# Altium footprint library Velotour_2022.PcbLib: 30 footprints (part 2 of 2)
Each footprint in its own frame and in the unit in brackets; x right, y up, seen from the top. Pads: shape width x height; smd on the part's side, far side on the other; paste and mask are expansions set on the pad; w line width, h text height; cw(c..) or ccw(c..) is an arc to the next point about the centre after c.
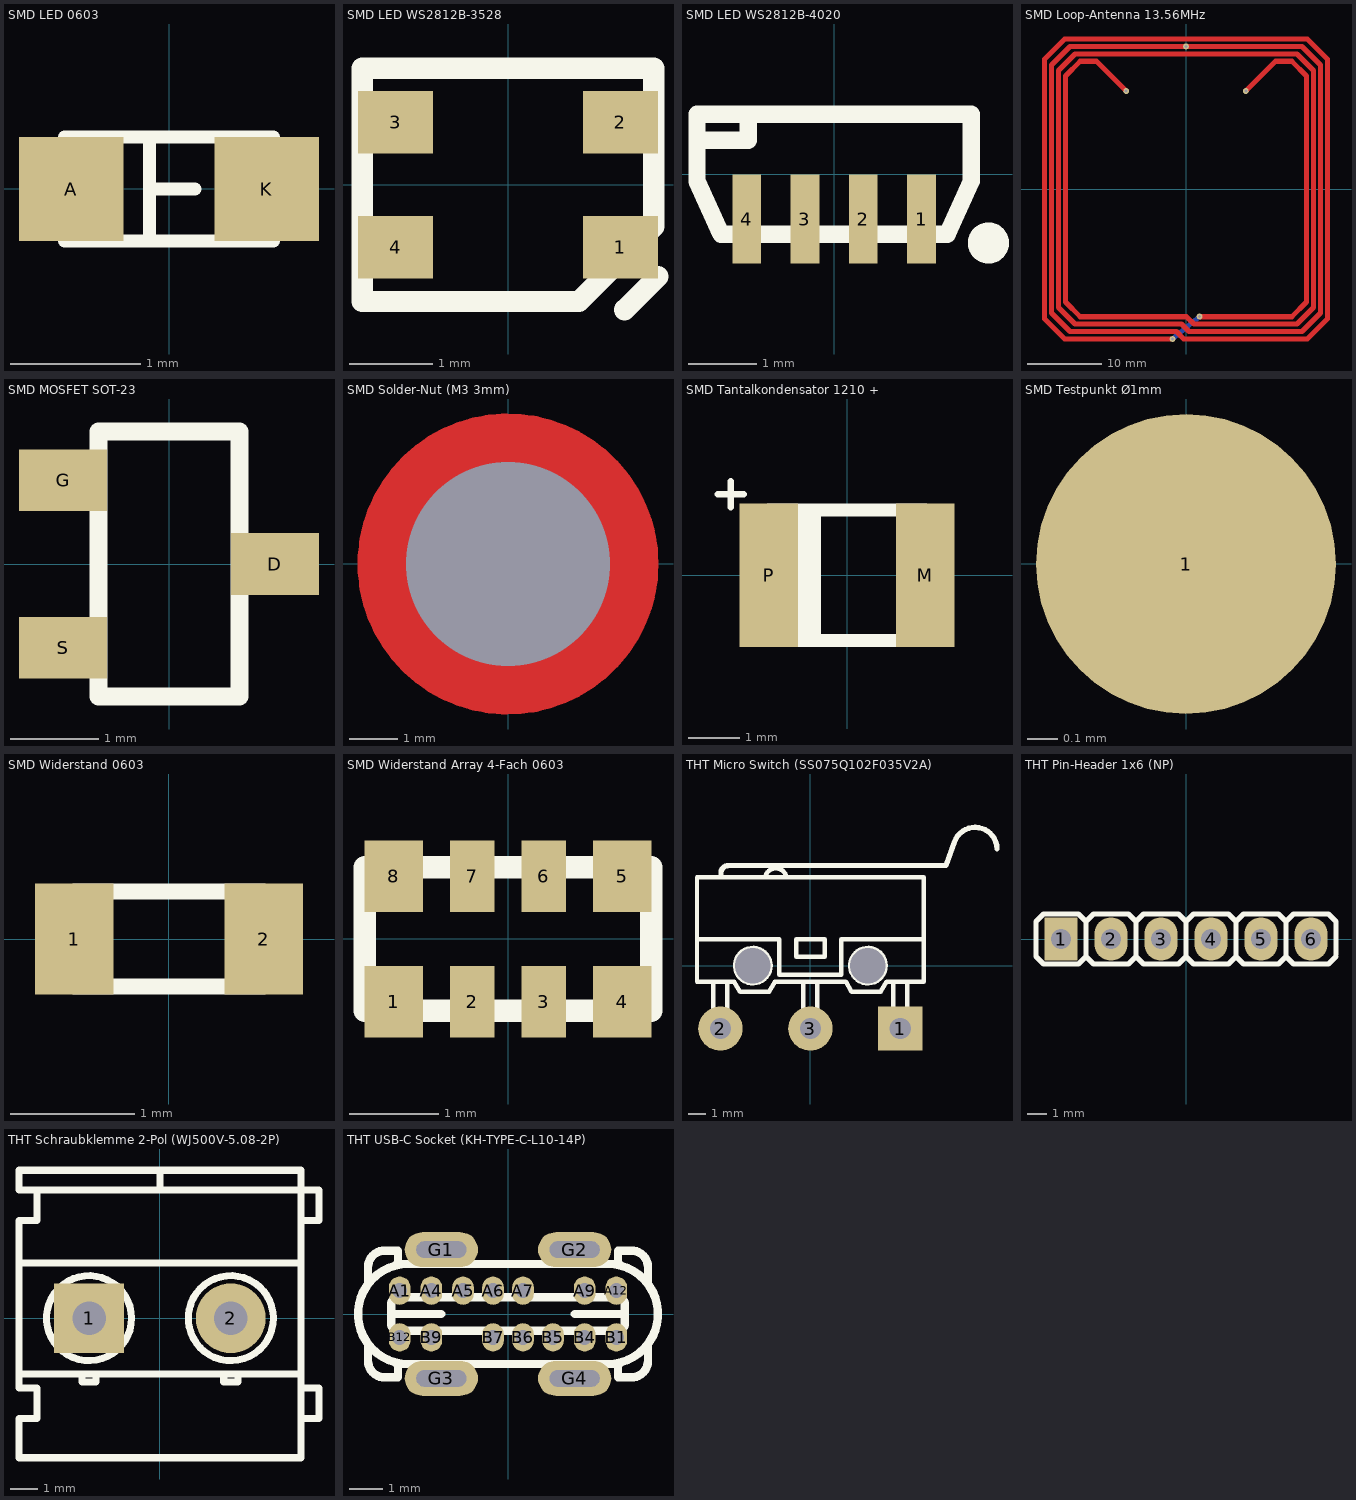
[diagram p1: the footprints below, top view; thin cyan lines are the x and y axes]

## SMD LED 0603 [mm] "SMD_LED_RED"
height 8.65
pads (2):
  rect 0.8x0.8 smd: A(-0.75,0) K(0.75,0)
Top Overlay:
  lines w0.1: -0.15,-0.4 -0.15,0.4 ; -0.15,0 0.2,0 ; -0.8,-0.4 0.8,-0.4 0.8,0.4 -0.8,0.4 -0.8,-0.4
3D body "User Library-LED SMD0603.step": height 0.68, standoff 0, extent -0.808,-0.368 0.842,0.357

## SMD LED WS2812B-3528 [mm] "SMD_LED_RED"
height 8.65
pads (4):
  rect 0.9x0.75 smd: 1(1.35,-0.75) 2(1.35,0.75) 3(-1.35,0.75) 4(-1.35,-0.75)
Top Overlay:
  lines w0.254: 1.4,-1.5 1.8,-1.1 ; -1.75,-1.4 -1.75,1.4 1.75,1.4 1.75,-0.5 0.85,-1.4 -1.75,-1.4
3D body "User Library-KAA-3528.x_t": height 1.9, standoff 0, extent -1.75,-1.4 1.75,1.4

## SMD LED WS2812B-4020 [mm] "SMD_LED_RED"
height 8.65
pads (4):
  rect 0.42x1.3 smd: 1(1.275,-0.65) 2(0.425,-0.65) 3(-0.425,-0.65) 4(-1.275,-0.65)
Top Overlay:
  circle w0.35: c2.25,-1 r0.125
  lines w0.254: -2,0.5 -1.25,0.5 -1.25,0.85 ; -2,-0.1 -2,0.875 2,0.875 2,-0.1 1.65,-0.875 -1.65,-0.875 -2,-0.1
3D body "User Library-WS2812-4020.x_b": height 2, standoff 0, extent -2,-0.875 2,0.875

## SMD Loop-Antenna 13.56MHz [mm]
pads (3):
  round 0.8 hole 0.4 mask+0.102: 1(8.095,13.255) 2(-8.095,13.255) 3(0,19.293)
via 1.85,-17.279 diameter 0.8 hole 0.4
via -1.85,-20.3 diameter 0.8 hole 0.4
Top Layer:
  lines w0.7: -8.095,13.255 -12.119,17.279 -14.321,17.279 -16.3,15.3 -16.3,-15.3 -14.321,-17.279 0.082,-17.279 1.089,-18.286 15.014,-18.286 17.25,-16.05 17.25,16.05 15.014,18.286 -15.014,18.286 -17.25,16.05 -17.25,-16.05 -15.014,-18.286 -0.611,-18.286 0.396,-19.293 15.707,-19.293 18.2,-16.8 18.2,16.8 15.707,19.293 -15.707,19.293 -18.2,16.8 -18.2,-16.8 -15.707,-19.293 -1.304,-19.293 -0.297,-20.3 16.4,-20.3 19.15,-17.55 19.15,17.55 16.4,20.3 -16.4,20.3 -19.15,17.55 -19.15,-17.55 -16.4,-20.3 -1.85,-20.3 ; 1.85,-17.279 14.321,-17.279 16.3,-15.3 16.3,15.3 14.321,17.279 12.119,17.279 8.095,13.255
Bottom Layer:
  lines w0.7: -1.85,-20.3 1.85,-17.279

## SMD MOSFET SOT-23 [mm]
pads (3):
  rect 1x0.7 smd: D(1.2,0) G(-1.2,0.95) S(-1.2,-0.95)
Top Overlay:
  lines w0.203: -0.8,-1.5 0.8,-1.5 0.8,1.5 -0.8,1.5 -0.8,-1.5
3D body "CircuitWorks-SOT-23.step": height 1.1, standoff 0, extent -1.301,-1.5 1.199,1.5

## SMD Solder-Nut (M3 3mm) [mm]
pads (1):
  round 0 hole 4.22: 1(0,0)
Top Layer:
  circle w1.02: c0,0 r2.61
Top Paste:
  region: -1.904,0.908 -1.82,1.067 -1.613,1.36 -1.36,1.613 -1.067,1.82 -0.908,1.904 -1.291,2.829 -1.545,2.714 -2.002,2.396 -2.396,2.002 -2.714,1.545 -2.829,1.291
  region: 0.704,1.989 0.533,2.042 0.179,2.102 -0.179,2.102 -0.533,2.042 -0.704,1.989 -1.087,2.914 -0.826,3.011 -0.278,3.11 0.278,3.11 0.826,3.011 1.087,2.914
  region: -0.908,-1.904 -1.067,-1.82 -1.36,-1.613 -1.613,-1.36 -1.82,-1.067 -1.904,-0.908 -2.829,-1.291 -2.714,-1.545 -2.396,-2.002 -2.002,-2.396 -1.545,-2.714 -1.291,-2.829
  region: -1.989,0.704 -2.042,0.533 -2.102,0.179 -2.102,-0.179 -2.042,-0.533 -1.989,-0.704 -2.914,-1.087 -3.011,-0.826 -3.11,-0.278 -3.11,0.278 -3.011,0.826 -2.914,1.087
  region: 1.904,-0.908 1.82,-1.067 1.613,-1.36 1.36,-1.613 1.067,-1.82 0.908,-1.904 1.291,-2.829 1.545,-2.714 2.002,-2.396 2.396,-2.002 2.714,-1.545 2.829,-1.291
  region: -0.704,-1.989 -0.533,-2.042 -0.179,-2.102 0.179,-2.102 0.533,-2.042 0.704,-1.989 1.087,-2.914 0.826,-3.011 0.278,-3.11 -0.278,-3.11 -0.826,-3.011 -1.087,-2.914
  region: 0.908,1.904 1.067,1.82 1.36,1.613 1.613,1.36 1.82,1.067 1.904,0.908 2.829,1.291 2.714,1.545 2.396,2.002 2.002,2.396 1.545,2.714 1.291,2.829
  region: 1.989,-0.704 2.042,-0.533 2.102,-0.179 2.102,0.179 2.042,0.533 1.989,0.704 2.914,1.087 3.011,0.826 3.11,0.278 3.11,-0.278 3.011,-0.826 2.914,-1.087
Top Solder:
  circle w1.102: c0,0 r2.661
3D body "SMTSO3030CTJ.x_t": height 3, standoff -1.53, extent -2.606,-2.606 2.606,2.606

## SMD Tantalkondensator 1210 + [mil]
pads (2):
  rect 45x110 smd: M(60,0) P(-60,0)
Top Overlay:
  rectangle: -60,-50 -20,50
  lines w5: -99,62 -79,62 ; -89,52 -89,72
  lines w10: -60,-50 -60,50 60,50 60,-50 -60,-50
3D body "User Library-AVX_BCASE.x_b": height 79.92, standoff 0, extent -72.83,-57.67 72.84,57.68

## SMD Testpunkt Ø1mm [mm]
pads (1):
  round 1 smd: 1(0,0)

## SMD Widerstand 0603 [mil]
height 66.93
pads (2):
  rect 25x35 smd: 1(-30,0) 2(30,0)
Top Overlay:
  lines w5: -30,-15 30,-15 30,15 -30,15 -30,-15
3D body "User Library-Panasonic0603.step": height 17.72, standoff 0, extent -31.5,-16.14 31.5,16.14

## SMD Widerstand Array 4-Fach 0603 [mm]
pads (8):
  rect 0.65x0.8 smd: 1(-1.275,-0.7) 4(1.275,-0.7) 5(1.275,0.7) 8(-1.275,0.7)
  rect 0.5x0.8 smd: 2(-0.4,-0.7) 3(0.4,-0.7) 6(0.4,0.7) 7(-0.4,0.7)
Top Overlay:
  lines w0.254: -1.6,-0.8 1.6,-0.8 1.6,0.8 -1.6,0.8 -1.6,-0.8
3D body "User Library-R-0603-Array-4-1.step": height 0.51, standoff -0.01, extent -1.6,-0.8 1.6,0.8

## THT Micro Switch (SS075Q102F035V2A) [mm]
pads (5):
  rect 2.5x2.5 hole 1.2: 1(5.08,-3.55)
  round 2.5 hole 1.2: 2(-5.08,-3.55) 3(0,-3.55)
  round 0 hole 2 unplated: NC(-3.25,0) NC(3.25,0)
Top Overlay:
  circle w0.254: c3.25,0 r1
  circle w0.254: c-3.25,0 r1
  lines w0.254: -6.4,1.5 -1.75,1.5 -1.75,-0.5 0,-0.5 1.75,-0.5 1.75,1.5 6.4,1.5 ; -5.48,-0.9 -5.48,-3.7 -5.08,-3.7 -4.68,-3.7 -4.68,-0.9 ; -5.05,5.05 -5.05,5.225 ; -2.542,5 cw(c-1.95,4.9) -1.358,5 ; -0.4,-0.9 -0.4,-3.7 0,-3.7 0.4,-3.7 0.4,-0.9 ; 4.68,-0.9 4.68,-3.7 5.08,-3.7 5.48,-3.7 5.48,-0.9 ; -6.4,-0.9 -6.4,5 0,5 6.4,5 6.4,-0.9 4.3,-0.9 3.968,-1.482 2.332,-1.482 2,-0.9 0,-0.9 -2,-0.9 -2.332,-1.482 -3.968,-1.482 -4.3,-0.9 -6.4,-0.9 ; -0.8,0.5 0,0.5 0.8,0.5 0.8,1.5 0,1.5 -0.8,1.5 -0.8,0.5
  lines w0.3: -5.05,5.025 -5.05,5.2 ; -5.05,5.225 cw(c-4.625,5.225) -4.625,5.65 7.65,5.65 8.139,6.995 cw(c9.3,6.575) 10.534,6.597
3D body "SS075xx02FxxxV2A.x_t": height 5.8, standoff -3.8, extent -6.4,-3.75 10.7,7.969

## THT Pin-Header 1x6 (NP) [mm] "Capacitor, Electrolytic, Radial; Body 5 x 5 mm (Dia.xH typ); Pin Spacing 2 mm (typ)"
height 6
pads (6):
  rect 1.7x2.2 hole 1: 1(-6.35,0)
  oval 1.7x2.2 hole 1: 2(-3.81,0) 3(-1.27,0) 4(1.27,0) 5(3.81,0) 6(6.35,0)
Top Overlay:
  lines w0.254: 7.62,-0.889 7.239,-1.27 5.461,-1.27 5.08,-0.889 ; 7.62,-0.762 7.62,0.889 7.239,1.27 5.461,1.27 5.08,0.889 ; -7.62,-0.889 -7.62,0.889 ; -7.62,-0.889 -7.239,-1.27 -5.461,-1.27 -5.08,-0.889 ; -7.62,-0.889 -7.62,-0.762 -7.62,0.889 ; -7.62,0.889 -7.239,1.27 -5.461,1.27 -5.08,0.889 ; -5.08,-0.889 -5.08,0.889 ; -5.08,-0.889 -4.699,-1.27 -2.921,-1.27 -2.54,-0.889 ; -5.08,-0.889 -5.08,-0.762 -5.08,0.889 ; -5.08,0.889 -4.699,1.27 -2.921,1.27 -2.54,0.889 ; -2.54,-0.889 -2.54,0.889 ; -2.54,-0.889 -2.159,-1.27 -0.381,-1.27 0,-0.889 ; -2.54,-0.889 -2.54,-0.762 -2.54,0.889 ; -2.54,0.889 -2.159,1.27 -0.381,1.27 0,0.889 ; 0,-0.889 0,0.889 ; 0,-0.889 0.381,-1.27 2.159,-1.27 2.54,-0.889 ; 0,-0.889 0,-0.762 0,0.889 ; 0,0.889 0.381,1.27 2.159,1.27 2.54,0.889 ; 2.54,-0.889 2.54,0.889 ; 2.54,-0.889 2.921,-1.27 4.699,-1.27 5.08,-0.889 ; 2.54,-0.889 2.54,-0.762 2.54,0.889 ; 2.54,0.889 2.921,1.27 4.699,1.27 5.08,0.889 ; 5.08,-0.889 5.08,0.889 ; 5.08,-0.889 5.08,-0.762 5.08,0.889

## THT Schraubklemme 2-Pol (WJ500V-5.08-2P) [mm]
height 7.4
pads (2):
  rect 2.5x2.5 hole 1.2: 1(-2.54,0)
  round 2.5 hole 1.2: 2(2.54,0)
Top Overlay:
  circle w0.254: c-2.54,0 r1.524
  circle w0.254: c2.54,0 r1.524
  lines w0.254: -5.05,5.25 -5.05,4.6 ; -5.05,5.3 0,5.3 ; -2.794,-2 -2.794,-2.286 -2.286,-2.286 -2.286,-2 ; 2.286,-2 2.286,-2.286 2.794,-2.286 2.794,-2 ; 5.05,-3.6 5.7,-3.6 5.7,-2.5 5.05,-2.5 ; 5.05,-2 0,-2 -5.05,-2 ; 5.05,1.978 -5.05,1.978 ; 5.05,3.5 5.7,3.5 5.7,4.6 5.05,4.6 0,4.6 ; -5.05,-2 -5.05,1.978 ; -5.05,-2 -5.05,-2.5 -4.4,-2.5 -4.4,-3.6 -5.05,-3.6 -5.05,-5 -0.8,-5 5.05,-5 5.05,5.3 0,5.3 ; -5.05,1.978 -5.05,3.5 -4.4,3.5 -4.4,4.6 -5.05,4.6 ; -5.05,4.6 0,4.6 ; 0,4.6 0,5.3
3D body "KF128-5.08-2P.STEP": height 14.24, standoff -3.71, extent -5.075,-5 5.685,5.3

## THT USB-C Socket (KH-TYPE-C-L10-14P) [mm]
pads (18):
  oval 0.65x0.85 hole 0.45: A1(-3.25,0.7) A4(-2.3,0.7) A5(-1.35,0.7) A6(-0.45,0.7) A7(0.45,0.7) A9(2.3,0.7) A12(3.25,0.7) B1(3.25,-0.7) B4(2.3,-0.7) B5(1.35,-0.7) B6(0.45,-0.7) B7(-0.45,-0.7) B9(-2.3,-0.7) B12(-3.25,-0.7)
  oval 2.2x1.05 hole 0.5 slot 1.5 at 0 deg: G1(-2,1.93) G2(2,1.93) G3(-2,-1.93) G4(2,-1.93)
Top Overlay:
  lines w0.254: -4.2,-0.9 -4.2,-1.4 ccw(c-3.7,-1.4) -3.7,-1.9 -3.3,-1.9 -3.3,-1.5 ; -4.2,0.9 -4.2,1.4 cw(c-3.7,1.4) -3.7,1.9 -3.3,1.9 -3.3,1.5 ; -2.7,-1.5 -2.7,-2.1 -1.3,-2.1 -1.3,-1.5 ; -2.7,1.5 -2.7,2.1 -1.3,2.1 -1.3,1.5 ; -2,0 -3.5,0 ; 1.3,-1.5 1.3,-2.1 2.7,-2.1 2.7,-1.5 ; 1.3,1.5 1.3,2.1 2.7,2.1 2.7,1.5 ; 2,0 3.5,0 ; 3.3,-1.5 3.3,-1.9 3.7,-1.9 ccw(c3.7,-1.4) 4.2,-1.4 4.2,-0.9 ; 3.3,1.5 3.3,1.9 3.7,1.9 cw(c3.7,1.4) 4.2,1.4 4.2,0.9 ; -3.5,0 -3.5,0.3 cw(c-3.3,0.3) -3.3,0.5 0,0.5 3.3,0.5 cw(c3.3,0.3) 3.5,0.3 3.5,0 ; -3.5,0 -3.5,-0.3 ccw(c-3.3,-0.3) -3.3,-0.5 0,-0.5 3.3,-0.5 ccw(c3.3,-0.3) 3.5,-0.3 3.5,0 ; -3,-1.5 cw(c-3,0) -3,1.5 3,1.5 cw(c3,0) 3,-1.5 -3,-1.5
3D body "KH-TYPE-C-L10-14P.x_t": height 10, standoff -2, extent -4.47,-2.08 4.47,2.08